# Altium schematic symbol library lib_datalogger.SchLib: 1246 symbols (part 15 of 16)
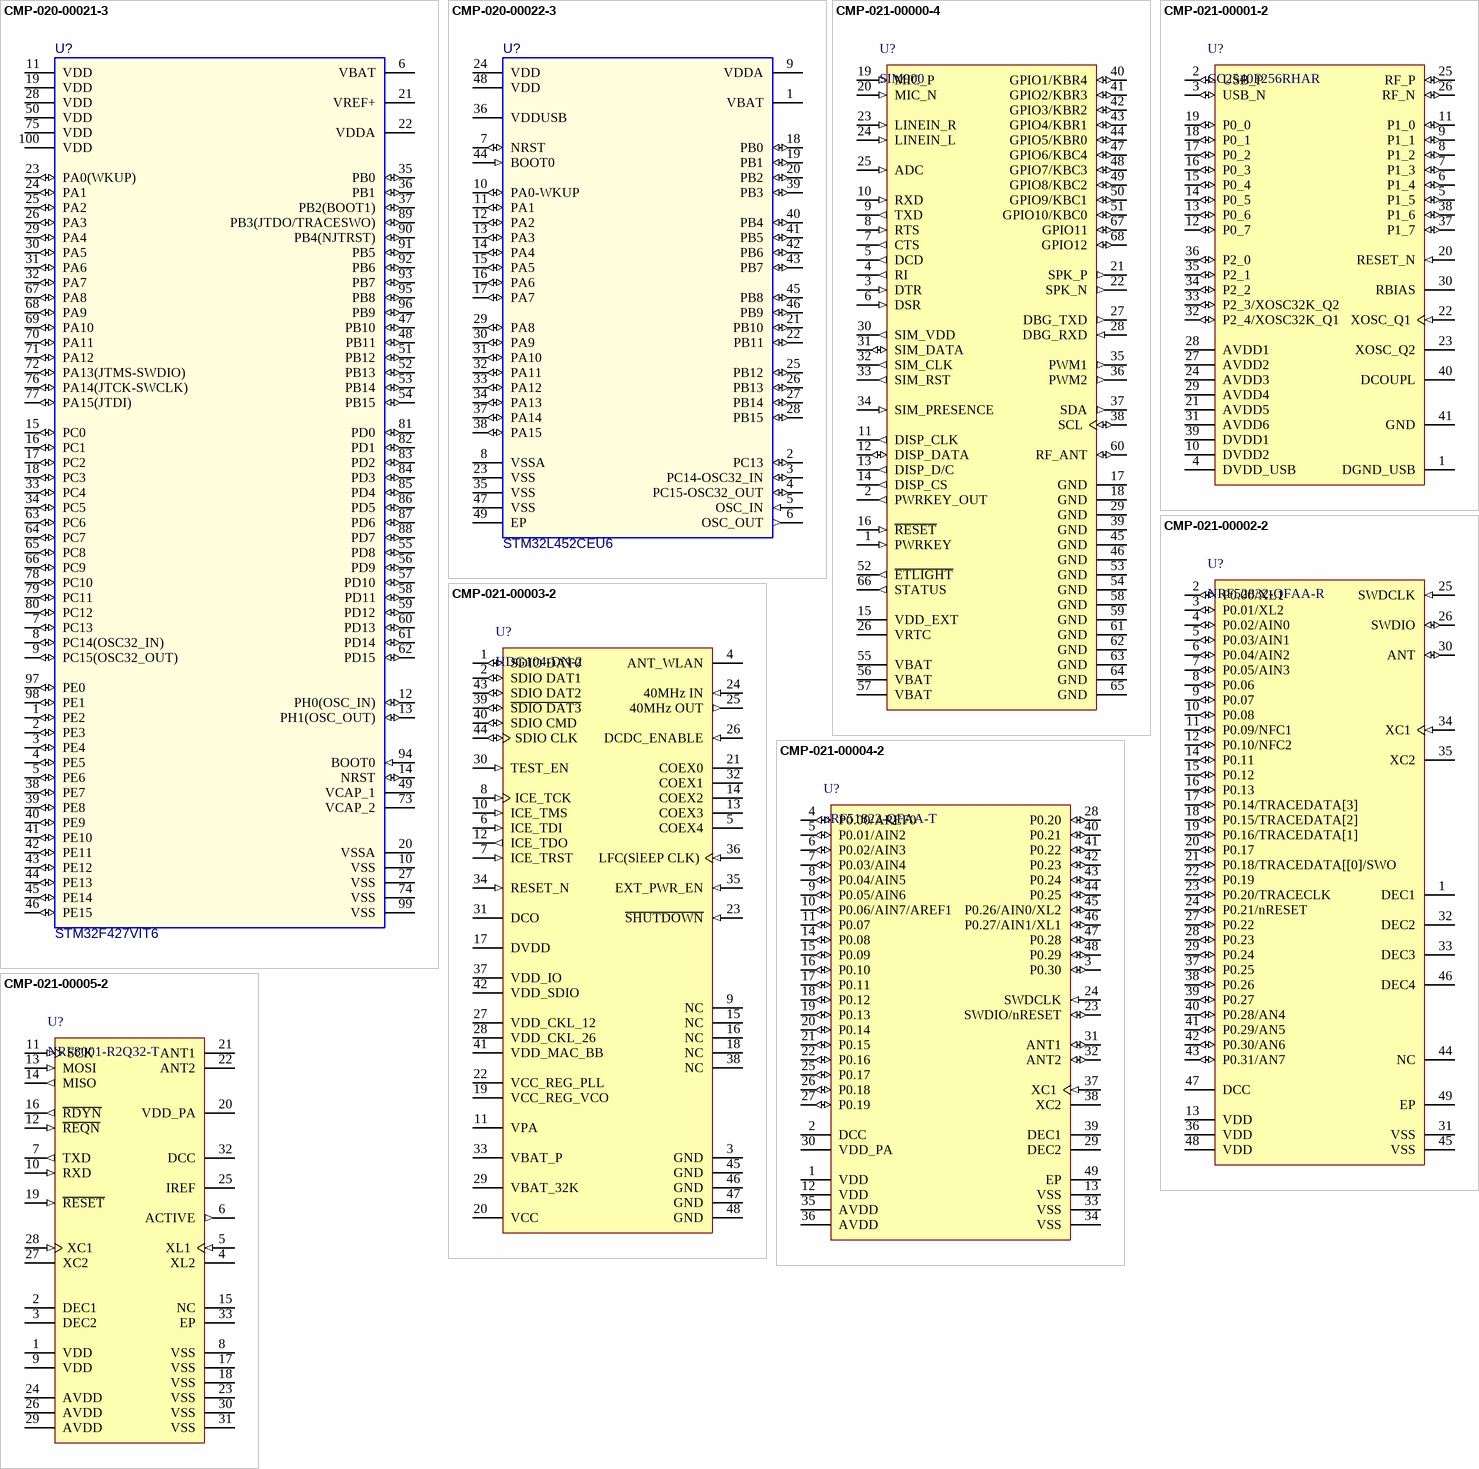
[diagram p57: symbols CMP-020-00021-3 to CMP-021-00005-2]

## CMP-021-00005-2
designator U?, comment NRF8001-R2Q32-T
Single-Chip Bluetooth(R) Low Energy Solution, 1.9 to 3.6 V, -40 to 85 degC, 32-Pin QFN, RoHS, Tray; Manufacturer: Nordic Semiconductor; Max Supply Voltage: 3.6V; Data Rate: 1Mbps; Min Supply Voltage: 1.9V; Nominal Supply Voltage: 3V; Package Description: 32-Pin Quad Flat No-lead Package, Body 5 x 5 mm, Pitch 0.5 mm; Mounting Technology: SM; Datasheet Version: Rev. 1.1, 10/2012; Pins: 32; Case/Package: QFN; Min Operating Temperature: -40°C; Max Operating Temperature: 85°C; Packaging: Tray; Datasheet URL: https://datasheet.ciiva.com/4914/nrf8001-ps-v-1-1-2797-4914162.pdf; Manufacturer URL: http://www.nordicsemi.com/eng/Products/; RoHS Compliant: True; Package Quantity: 490; Package Reference: QFN-32
footprint NRSC-QFN-32_L (QFN, 32-Leads, Body 5.1x5.1mm, Pitch 0.50mm, Thermal Pad 3.6x3.6mm, IPC High Density)
footprint NRSC-QFN-32_M (QFN, 32-Leads, Body 5.1x5.1mm, Pitch 0.50mm, Thermal Pad 3.6x3.6mm, IPC Low Density)
footprint NRSC-QFN-32_N (QFN, 32-Leads, Body 5.1x5.1mm, Pitch 0.50mm, Thermal Pad 3.6x3.6mm, IPC Medium Density)
pins: 1 VDD (power) "Power supply (1.9 - 3.6V)", 2 DEC1 (power) "Regulated power supply output for decoupling purposes only.", 3 DEC2 (power) "Regulated power supply output for decoupling purposes only.", 4 XL2 "Connect to 32.768 kHz crystal oscillator.", 5 XL1 (in) "Connect to 32.768 kHz crystal oscillator or external 32.768 kHz clock reference.", 6 ACTIVE (out) "Device RF front end activity indicator.", 7 TXD (out) "UART (transmit) for Bluetooth low energy Direct Test Interface.", 8 VSS (power) "Ground (0V)", 9 VDD (power) "Power supply (1.9 - 3.6V)", 10 RXD (in) "UART (receive) for Bluetooth low energy Direct Test Interface.", 11 SCK (in) "ACI clock input.", 12 ~{REQN} (in) "ACI request pin (handshaking, active low).", 13 MOSI (in) "ACI Master Out Slave In.", 14 MISO (out) "ACI Master In Slave Out.", 15 NC "Not connected.", 16 ~{RDYN} (out) "ACI device ready indication (handshaking, active low).", 17 VSS (power) "Ground (0V)", 18 VSS (power) "Ground (0V)", 19 ~{RESET} (in) "Reset (active low)", 20 VDD_PA (power) "Regulated power supply output for on-chip RF Power amplifier.", 21 ANT1 "Differential antenna connection (TX and RX)", 22 ANT2 "Differential antenna connection (TX and RX)", 23 VSS (power) "Ground (0V)", 24 AVDD (power) "Analog power supply (1.9 - 3.6V DC)", 25 IREF "Current reference terminal.", 26 AVDD (power) "Analog power supply (1.9 - 3.6V)", 27 XC2 "Connection for 16 MHz crystal oscillator.", 28 XC1 (in) "Connection for 16 MHz crystal or external 16MHz reference.", 29 AVDD (power) "Analog power supply (1.9 - 3.6V DC)", 30 VSS (power) "Ground (0V)", 31 VSS (power) "Ground (0V)", 32 DCC (power) "Pulse Width Modulated (PWM) driver for the external LC filter if the DC/DC converter is enable.", 33 EP (power) "Ground (0V)"

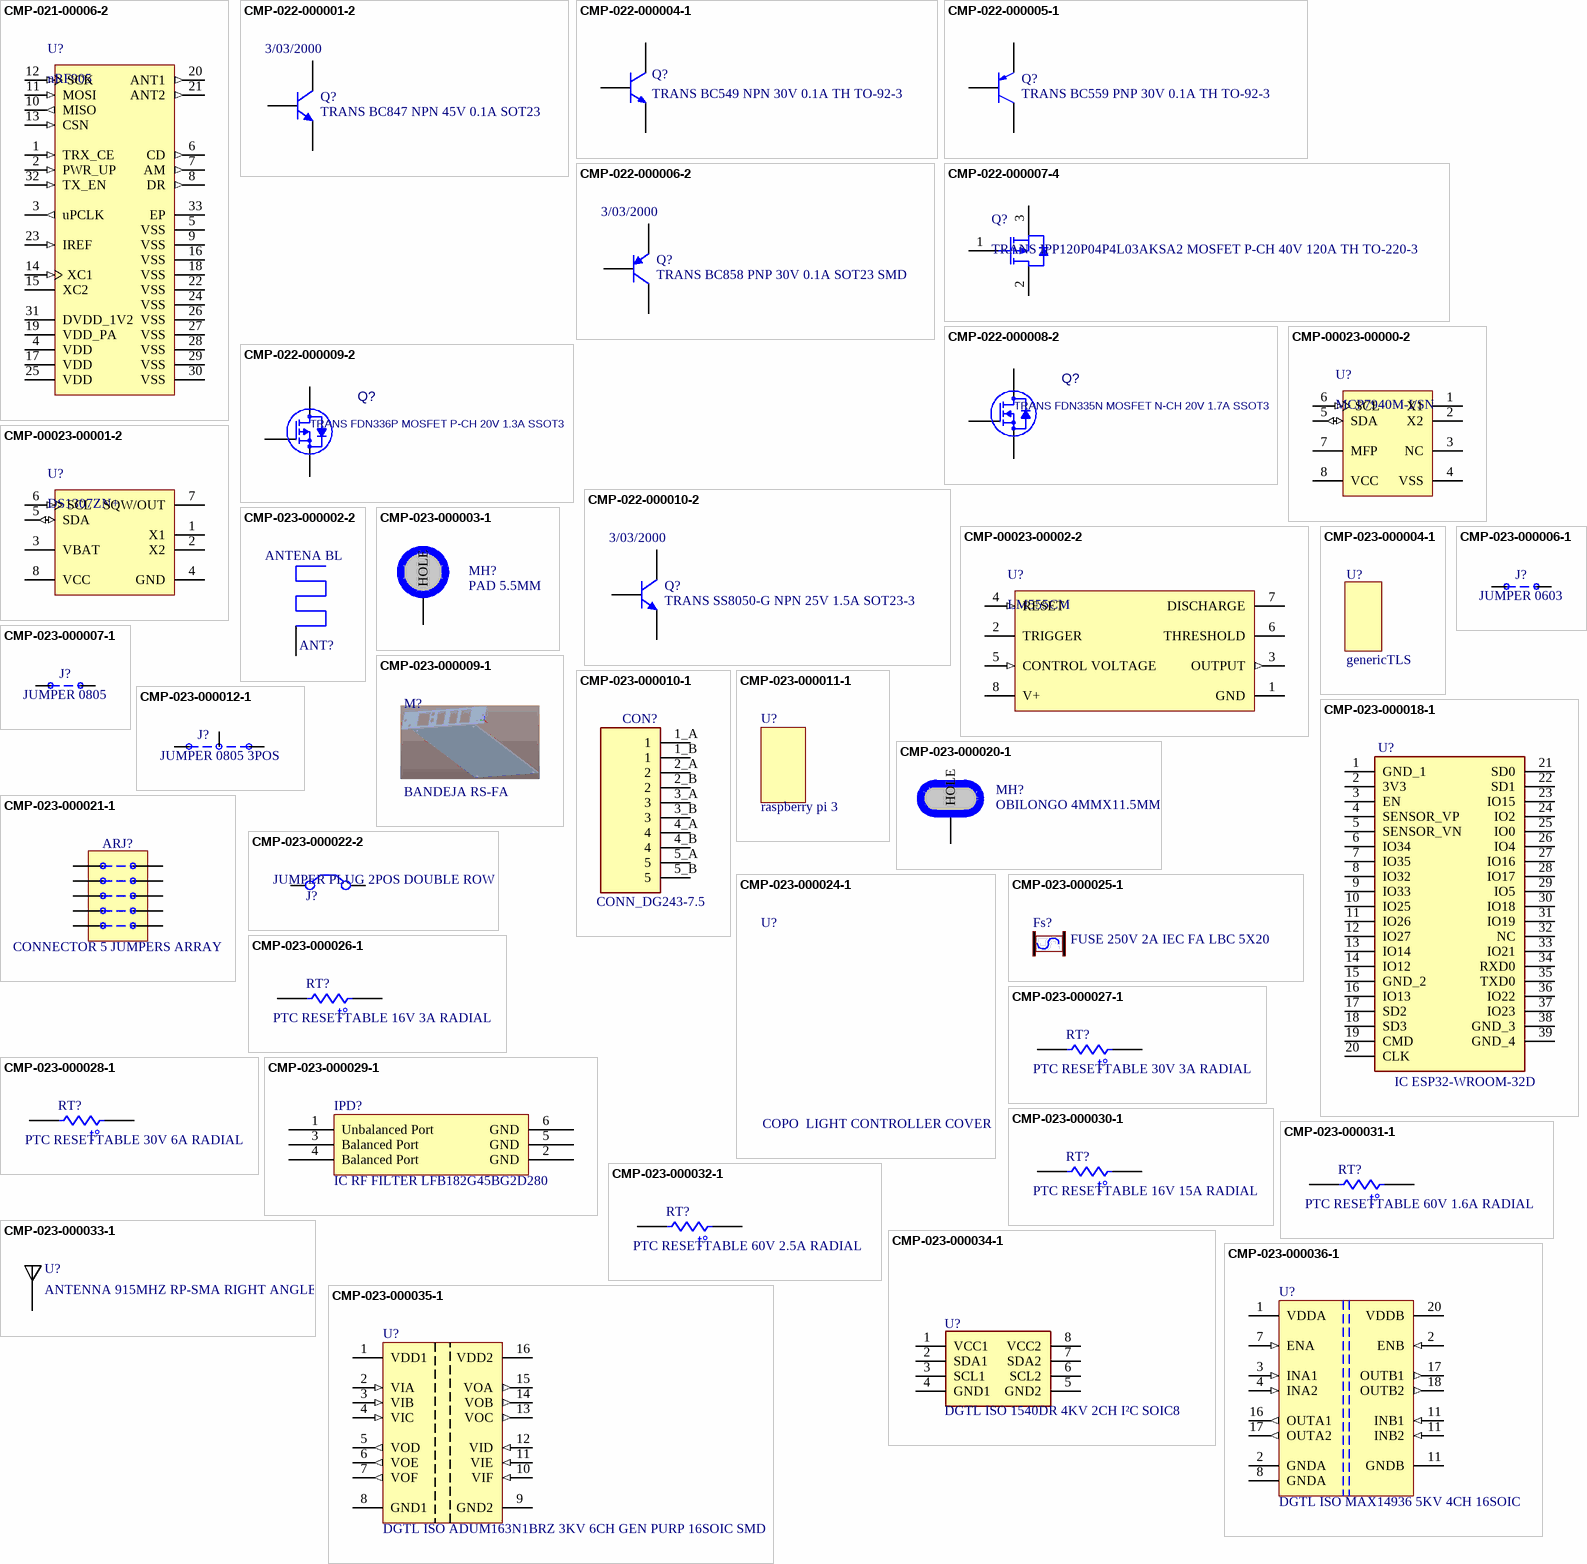
[diagram p41: symbols CMP-021-00006-2 to CMP-023-000036-1]

## CMP-021-00006-2
designator U?, comment nRF905
Single Chip Transceiver, 433 MHz, 1.9 to 3.6 V, -40 to 85 degC, 32-Pin QFN, RoHS, Tray; Manufacturer: Nordic Semiconductor; Interface: SPI; Frequency: 433MHz; Max Supply Voltage: 3.3V; Data Rate: 50Kbps; Min Supply Voltage: 1.9V; Mounting Technology: SM; Datasheet Version: Rev. 1.5, 04/2008; Min Operating Temperature: -40°C; RoHS Compliant: True; Manufacturer URL: http://www.nordicsemi.com/eng/Products/; Case/Package: QFN; Package Reference: QFN-32L; Pins: 32; Packaging: Tray; Package Quantity: 490; Datasheet URL: http://www.nordicsemi.com/eng/content/download/2452/29528/file/Product_Specification_nRF905_v1.5.pdf; Package Description: 32-Pin Quad Flat No-lead Package, Body 5 x 5 mm, Pitch 0.5 mm; Max Operating Temperature: 85°C
footprint NRSC-QFN-32L_M (QFN, 32-Leads, Body 5.00x5.00mm, Pitch 0.50mm, Thermal Pad 3.30x3.30mm, IPC Low Density)
footprint NRSC-QFN-32L_N (QFN, 32-Leads, Body 5.00x5.00mm, Pitch 0.50mm, Thermal Pad 3.30x3.30mm, IPC Medium Density)
footprint NRSC-QFN-32L_L (QFN, 32-Leads, Body 5.00x5.00mm, Pitch 0.50mm, Thermal Pad 3.30x3.30mm, IPC High Density)
pins: 1 TRX_CE (in) "Enables chip for receive and transmit", 2 PWR_UP (in) "Power up chip", 3 uPCLK (out) "Output clock, divided crystal oscillator full-swing clock", 4 VDD (power) "Power supply (+3V DC)", 5 VSS (power) "Ground (0V)", 6 CD (out) "Carrier Detect", 7 AM (out) "Address Match", 8 DR (out) "Receive and transmit Data Ready", 9 VSS (power) "Ground (0V)", 10 MISO (out) "SPI output", 11 MOSI (in) "SPI input", 12 SCK (in) "SPI clock", 13 CSN (in) "SPI enable, active low", 14 XC1 (in) "Crystal pin 1/ External clock reference pin", 15 XC2 "Crystal pin 2", 16 VSS (power) "Ground (0V)", 17 VDD (power) "Power supply (+3V DC)", 18 VSS (power) "Ground", 19 VDD_PA (power) "Positive supply (1.8V) to nRF905 power amplifier", 20 ANT1 (out) "Antenna interface 1", 21 ANT2 (out) "Antenna interface 2", 22 VSS (power) "Ground (0V)", 23 IREF (in) "Reference current", 24 VSS (power) "Ground (0V)", 25 VDD (power) "Power supply (+3V DC)", 26 VSS (power) "Ground (0V)", 27 VSS (power) "Ground (0V)", 28 VSS (power) "Ground (0V)", 29 VSS (power) "Ground (0V)", 30 VSS (power) "Ground (0V)", 31 DVDD_1V2 (power) "Low voltage positive digital supply output for de-coupling", 32 TX_EN (in) "TX_EN=”1”TX mode, TX_EN=”0”RX mode", 33 EP "Ground (0V)"

## CMP-022-000001-2
designator Q?, comment TRANS BC847 NPN 45V 0.1A SOT23  Created: 3/03/2000
TRANS NPN 45V 0.1A SOT23; Manufacturer Part Number: BC847A,215; Manufacturer: Nexperia USA Inc.; Vce Saturation (Max) @ Ib, Ic: 400mV @ 5mA, 100mA; Current - Collector (Ic) (Max): 100mA; Current - Collector Cutoff (Max): 15nA (ICBO); Frequency - Transition: 100MHz; Power - Max: 250mW; DC Current Gain (hFE) (Min) @ Ic, Vce: 110 @ 2mA, 5V; Packaging: Cut Tape (CT); Design Item ID: TRANS BC847 NPN 45V 0.1A SOT23; Mounting Type: Surface Mount; Pricing 1: 1=0.13, 10=0.119, 100=0.0648, 500=0.03986, 1000=0.02718 (USD); Transistor Type: NPN; Package / Case: TO-236-3, SC-59, SOT-23-3; Stock 1: 10323; ComponentLink1URL: http://assets.nexperia.com/documents/data-sheet/BC847_SER.pdf; Category: Discrete Semiconductor Products; Operating Temperature: 150°C (TJ); ComponentLink1Description: http://assets.nexperia.com/documents/data-sheet/BC847_SER.pdf; RoHS: RoHS Compliant; Supplier Device Package: TO-236AB (SOT23); Source: mits.SchLib; Part Status: Active; Voltage - Collector Emitter Breakdown (Max): 45V
footprint SOT-23
footprint SOT-23
pins: 1 B, 2 E, 3 C

## CMP-022-000004-1
designator Q?, comment TRANS BC549 NPN 30V 0.1A TH TO-92-3
BC549 Series 30 V 100 mA Through Hole NPN Epitaxial Silicon Transistor - TO-92-3; Manufacturer Part Number: BC858CLT1G; Manufacturer: ON Semiconductor; Vce Saturation (Max) @ Ib, Ic: 650mV @ 5mA, 100mA; DC Current Gain (hFE) (Min) @ Ic, Vce: 420 @ 2mA, 5V; Emitter Base Voltage (VEBO): 5V; Max Frequency: 1MHz; Gain Bandwidth Product: 300MHz; Max Power Dissipation: 500mW; hFE Min: 110; Max Collector Current: 100mA; Collector Emitter Saturation Voltage: 250mV; Frequency - Transition: 100MHz; Number of Elements: 1; Transistor Type: PNP; Element Configuration: Single; Power - Max: 300mW; Current - Collector Cutoff (Max): 15nA (ICBO); Height: 4.58mm; Number of Pins: 3; RoHS: RoHS Compliant; REACH SVHC: No SVHC; Voltage Rating (DC): 30V; Stock 1: 45987; ComponentLink3URL: https://datasheet.ciiva.com/4721/bc549-4721850.pdf?src-supplier=Mouser; ComponentLink4URL: https://datasheet.ciiva.com/17179/bc546-17179565.pdf?src-supplier=Future+Electronics; Packaging: Cut Tape (CT); Polarity: NPN; ComponentLink3Description: https://datasheet.ciiva.com/4721/bc549-4721850.pdf?src-supplier=Mouser; Min Operating Temperature: -65°C; Length: 4.58mm; ComponentLink2URL: https://datasheet.ciiva.com/11205/bc550-11205928.pdf?src-supplier=Avnet; Case/Package: TO-92; ComponentLink1URL: http://www.onsemi.com/pub_link/Collateral/BC856ALT1-D.PDF; Weight: 0.24g; Max Breakdown Voltage: 30V; Current - Collector (Ic) (Max): 100mA; Design Item ID: TRANS BC549 NPN 30V 0.1A TH TO-92-3; Part Status: Active; Mounting Type: Surface Mount; Power Dissipation: 500mW; Operating Temperature: -55°C ~ 150°C (TJ); Pricing 2: 1=0,20000, 10=0,16700, 100=0,06840, 500=0,05706, 1000=0,03965 (USD); Stock 2: 1270; Package / Case: TO-236-3, SC-59, SOT-23-3; Mount: Through Hole; Transition Frequency: 300MHz; Pricing 1: 1=0.13, 10=0.121, 100=0.0658, 500=0.04048, 1000=0.0276 (USD); Collector Emitter Voltage (VCEO): 30V; ComponentLink2Description: https://datasheet.ciiva.com/11205/bc550-11205928.pdf?src-supplier=Avnet; Contact Plating: Tin,Matte; Lead Free: Lead Free; Collector Emitter Breakdown Voltage: 30V; Collector Base Voltage (VCBO): 30V; Voltage - Collector Emitter Breakdown (Max): 30V; Category: Discrete Semiconductor Products; Source: mits.SchLib; ComponentLink1Description: http://www.onsemi.com/pub_link/Collateral/BC856ALT1-D.PDF; Package Quantity: 2000; Max Operating Temperature: 150°C; Current Rating: 100mA; Frequency: 300MHz; ComponentLink4Description: https://datasheet.ciiva.com/17179/bc546-17179565.pdf?src-supplier=Future+Electronics; Width: 3.86mm; Supplier Device Package: SOT-23-3 (TO-236)
footprint TO - 92 3
footprint TO - 92 3
pins: ?1, ?2, ?3

## CMP-022-000005-1
designator Q?, comment TRANS BC559 PNP 30V 0.1A TH TO-92-3
Trans GP BJT PNP 30V 0.1A 3-Pin TO-92 Ammo; Manufacturer Part Number: BC559CTA; Manufacturer: ON Semiconductor / Fairchild; Gain Bandwidth Product: 150MHz; Element Configuration: Single; hFE Min: 110; Collector Base Voltage (VCBO): -30V; Max Power Dissipation: 500mW; Collector Emitter Saturation Voltage: -250mV; Number of Elements: 1; Emitter Base Voltage (VEBO): -5V; Max Collector Current: 100mA; Current Rating: -100mA; Max Frequency: 10MHz; ComponentLink1URL: http://www.onsemi.com/pub_link/Collateral/BC856ALT1-D.PDF; Max Breakdown Voltage: 30V; ComponentLink4Description: https://datasheet.ciiva.com/16774/bc559-16774030.pdf?src-supplier=Future+Electronics; Contact Plating: Tin,Matte; Mount: Through Hole; Source: mits.SchLib; Category: BJTs; Lead Free: Lead Free; Weight: 0.24g; Width: 4.19mm; Frequency: 150MHz; ComponentLink3URL: https://datasheet.ciiva.com/11208/bc559-11208039.pdf?src-supplier=Avnet; ComponentLink5Description: https://datasheet.ciiva.com/25997/bc559-25997151.pdf?src-supplier=Avnet+Europe; Package Quantity: 2000; Case/Package: TO-92-3; ComponentLink1Description: http://www.onsemi.com/pub_link/Collateral/BC856ALT1-D.PDF; ComponentLink2URL: https://datasheet.ciiva.com/4721/bc559-4721461.pdf?src-supplier=Mouser; Height: 5.33mm; Min Operating Temperature: -65°C; Collector Emitter Voltage (VCEO): 30V; Stock 1: 6065; ComponentLink5URL: https://datasheet.ciiva.com/25997/bc559-25997151.pdf?src-supplier=Avnet+Europe; Max Operating Temperature: 150°C; ComponentLink2Description: https://datasheet.ciiva.com/4721/bc559-4721461.pdf?src-supplier=Mouser; REACH SVHC: No SVHC; RoHS: Yes; Power Dissipation: 500mW; ComponentLink4URL: https://datasheet.ciiva.com/16774/bc559-16774030.pdf?src-supplier=Future+Electronics; Polarity: PNP; Number of Pins: 3; ComponentLink3Description: https://datasheet.ciiva.com/11208/bc559-11208039.pdf?src-supplier=Avnet; Packaging: Ammo Pack; Pricing 1: 1=0,23000, 10=0,18600, 100=0,07610, 500=0,06350, 1000=0,04412 (USD); Voltage Rating (DC): -30V; Design Item ID: TRANS BC559 PNP 30V 0.1A TH TO-92-3; Transition Frequency: 150MHz; Collector Emitter Breakdown Voltage: 30V; Length: 5.2mm
footprint TO - 92 3
footprint TO - 92 3
pins: 1 C, 3 E, B 2

## CMP-022-000006-2
designator Q?, comment TRANS BC858 PNP 30V 0.1A SOT23 SMD  Created: 3/03/2000
TRANS PNP 30V 0.1A SOT23; Manufacturer: ON Semiconductor; Manufacturer Part Number: BC858CLT1G; Vce Saturation (Max) @ Ib, Ic: 650mV @ 5mA, 100mA; Current - Collector (Ic) (Max): 100mA; Current - Collector Cutoff (Max): 15nA (ICBO); DC Current Gain (hFE) (Min) @ Ic, Vce: 420 @ 2mA, 5V; Power - Max: 300mW; Frequency - Transition: 100MHz; Stock 1: 45987; Pricing 1: 1=0.13, 10=0.121, 100=0.0658, 500=0.04048, 1000=0.0276 (USD); ComponentLink1Description: http://www.onsemi.com/pub_link/Collateral/BC856ALT1-D.PDF; Voltage - Collector Emitter Breakdown (Max): 30V; Operating Temperature: -55°C ~ 150°C (TJ); Package / Case: TO-236-3, SC-59, SOT-23-3; Category: Discrete Semiconductor Products; RoHS: RoHS Compliant; Design Item ID: TRANS BC858 PNP 30V 0.1A SOT23 SMD; Transistor Type: PNP; ComponentLink1URL: http://www.onsemi.com/pub_link/Collateral/BC856ALT1-D.PDF; Supplier Device Package: SOT-23-3 (TO-236); Packaging: Cut Tape (CT); Part Status: Active; Mounting Type: Surface Mount; Source: mits.SchLib
footprint SOT-23
footprint SOT-23
pins: 1 B, 2 E, 3 C

## CMP-022-000007-4
designator Q?, comment TRANS IPP120P04P4L03AKSA2 MOSFET P-CH 40V 120A TH TO-220-3
MOSFET, TO-220, 40V 120A; Gate to Source Voltage (Vgs): 16V; Fall Time: 57ns; Max Power Dissipation: 136W; Rds On Max: 3.4mR; Turn-Off Delay Time: 85ns; Max Dual Supply Voltage: -40V; Input Capacitance: 15nF; Drain to Source Resistance: 5.2mR; Element Configuration: Single; Turn-On Delay Time: 21ns; Rise Time: 16ns; Mount: Through Hole; RoHS Compliant: Yes; Continuous Drain Current (ID): 120A; Height: 15.65mm; Halogen Free: Halogen Free; Width: 4.4mm; Packaging: Rail/Tube; Lead Free: Contains Lead; Max Operating Temperature: 175°C; Min Operating Temperature: -55°C; Length: 10mm; Drain to Source Voltage (Vdss): -40V; Series: Automotive, AEC-Q101, OptiMOS™; Case/Package: TO-220-3; Number of Pins: 3
footprint TO-220
pins: 1 GATE, 2 DRAIN, 3 SOURCE

## CMP-022-000008-2
designator Q?, comment TRANS FDN335N MOSFET N-CH 20V 1.7A SSOT3
MOSFET N-CH 20V 1.7A SSOT3; Manufacturer: Fairchild Semiconductor; MSRP: 0,11655; eVendor#: FDN335NCT-ND; eVendorPrice: 0,42; eVendor: Digi-Key; MOQ: 1000; Part#: FDN335N; Source: mits.SchLib; Datasheet: http://www.fairchildsemi.com/ds/FD/FDN335N.pdf; Design Item ID: TRANS FDN335N MOSFET N-CH 20V 1.7A SSOT3
footprint SOT-23
footprint SOT-23
pins: 1 G "Gate", 2 S "Source", 3 D "Drain"

## CMP-022-000009-2
designator Q?, comment TRANS FDN336P MOSFET P-CH 20V 1.3A SSOT3
MOSFET P-CH 20V 1.3A SSOT3; Manufacturer: Fairchild Semiconductor; eVendor: Digi-Key; MSRP: 0,16240; eVendorPrice: 0,45; eVendor#: FDN336PCT-ND; Part#: FDN336P; Design Item ID: TRANS FDN336P MOSFET P-CH 20V 1.3A SSOT3; Datasheet: http://www.fairchildsemi.com/ds/FD/FDN335N.pdf; Source: mits.SchLib; MOQ: 1000
footprint SOT-23
footprint SOT-23
pins: 1 G "Gate", 2 S "Source", 3 D "Drain"

## CMP-022-000010-2
designator Q?, comment TRANS SS8050-G NPN 25V 1.5A SOT23-3  Created: 3/03/2000
TRANS NPN 25V 1.5A SOT23-3; Manufacturer Part Number: BC847A,215; Manufacturer: Nexperia USA Inc.; Power - Max: 250mW; Frequency - Transition: 100MHz; Voltage - Collector Emitter Breakdown (Max): 45V; Current - Collector (Ic) (Max): 100mA; Vce Saturation (Max) @ Ib, Ic: 400mV @ 5mA, 100mA; Current - Collector Cutoff (Max): 15nA (ICBO); DC Current Gain (hFE) (Min) @ Ic, Vce: 110 @ 2mA, 5V; RoHS: RoHS Compliant; Package / Case: TO-236-3, SC-59, SOT-23-3; Supplier Device Package: TO-236AB (SOT23); Pricing 1: 1=0.13, 10=0.119, 100=0.0648, 500=0.03986, 1000=0.02718 (USD); Part Status: Active; Source: mits.SchLib; Packaging: Cut Tape (CT); Stock 1: 10323; Transistor Type: NPN; Design Item ID: TRANS SS8050-G NPN 25V 1.5A SOT23-3; Operating Temperature: 150°C (TJ); Pricing 2: 20=0,02690, 200=0,02080, 600=0,01980, 2000=0,01860, 10000=0,01810, 20000=0,01780, 20=0,02590, 200=0,02000, 600=0,01900, 2000=0,01790, 10000=0,01740, 20000=0,01710, 20=0,13530, 200=0,10450, 600=0,09920, 2000=0,09330, 10000=0,09070, 20000=0,08940, 20=0,13010, 200=0,10040, 600=0,09540, 2000=0,08970, 10000=0,08720, 20000=0,08590, 20=0,01750, 200=0,01350, 600=0,01280, 2000=0,01210, 10000=0,01170, 20000=0,01160, 20=0,01500, 200=0,01150, 600=0,01100, 2000=0,01030, 10000=0,01000, 20000=0,00990, 20=0,16010, 200=0,12360, 600=0,11740, 2000=0,11040, 10000=0,10730, 20000=0,10570, 20=2,26320, 200=1,74690, 600=1,65900, 2000=1,56010, 10000=1,51610, 20000=1,49420, 20=0,08540, 200=0,06590, 600=0,06260, 2000=0,05880, 10000=0,05720, 20000=0,05640, 20=1,55840, 200=1,20280, 600=1,14230, 2000=1,07420, 10000=1,04400, 20000=1,02880, 20=0,17890, 200=0,13810, 600=0,13110, 2000=0,12330, 10000=0,11980, 20000=0,11810, 20=0,02780, 200=0,02140, 600=0,02040, 2000=0,01910, 10000=0,01860, 20000=0,01830, 20=0,02060, 200=0,01590, 600=0,01510, 2000=0,01420, 10000=0,01380, 20000=0,01360 (AUD); Mounting Type: Surface Mount; ComponentLink1URL: http://assets.nexperia.com/documents/data-sheet/BC847_SER.pdf; Category: Discrete Semiconductor Products; Stock 2: 48140; ComponentLink1Description: http://assets.nexperia.com/documents/data-sheet/BC847_SER.pdf
footprint SOT-23
footprint SOT-23
pins: 1 B, 2 E, 3 C

## CMP-00023-00000-2
designator U?, comment MCP7940M-I/SN
Low-Cost I2C(TM) Real-Time Clock/Calendar with SRAM, 64 Bytes SRAM, 1.8 to 5.5 V, -40 to 85 degC, 8-pin SOIC (SN8), Tube; Manufacturer: Microchip Technology; Package Version: C04-057C; Max Supply Voltage: 5.5V; Non-volatile Memory Size: 64B; Min Supply Voltage: 1.8V; Package Quantity: 100; Package URL: http://www.microchip.com/stellent/groups/techpub_sg/documents/packagingspec/en012702.pdf; Packaging: Rail/Tube; Case/Package: SOIC; Max Operating Temperature: 85°C; Manufacturer URL: http://www.microchip.com/; Package Description: 8-Lead Plastic Small Outline, Body 4.9 x 3.9 mm, Pitch 1.27 mm; Datasheet Version: Rev. A, 02/2012; Interface: I2C; Min Operating Temperature: -40°C; Mounting Technology: SM; Package Reference: SOIC-SN8; RoHS Compliant: True; Pins: 48; Datasheet URL: http://ww1.microchip.com/downloads/en/DeviceDoc/22292A.pdf
footprint MCHP-SOIC-SN8_V (SOIC, 8-Leads, Body 4.90x3.90mm, Pitch 1.27mm)
pins: 1 X1 "Xtal Input, External Oscillator Input", 2 X2 "Xtal Output", 3 NC "Not Connected", 4 VSS (power) "Ground", 5 SDA (io) "Bidirectional Serial Data", 6 SCL (in) "Serial Clock", 7 MFP (oc) "Multi-Function Pin", 8 VCC (power) "+1.8V to +5.5V Power Supply"
